# Altium footprint library CONNECTOR_JUMPER.PcbLib: 25 footprints (part 1 of 2)
Each footprint in its own frame and in the unit in brackets; x right, y up, seen from the top. Pads: shape width x height; smd on the part's side, far side on the other; paste and mask are expansions set on the pad; w line width, h text height; cw(c..) or ccw(c..) is an arc to the next point about the centre after c.
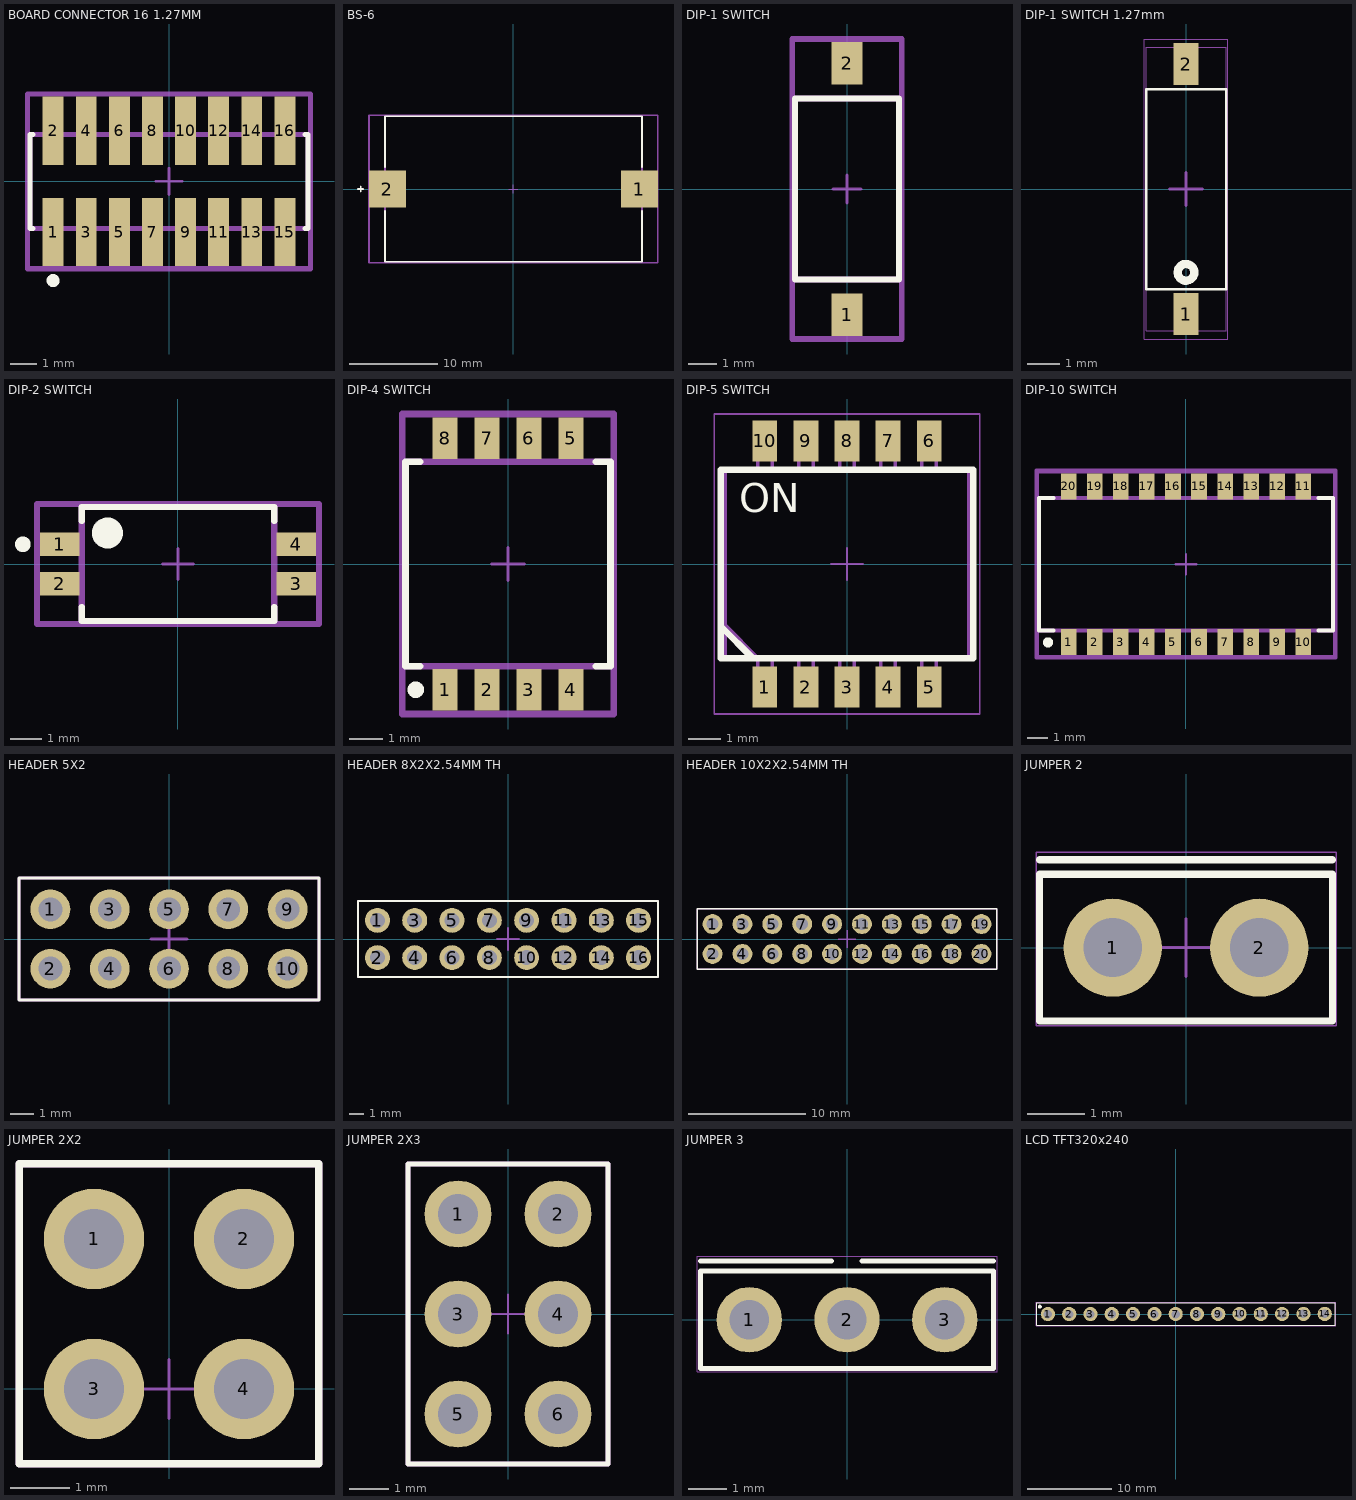
[diagram p0: the footprints below, top view; thin cyan lines are the x and y axes]

## BOARD CONNECTOR 16 1.27MM [mm]
pads (16):
  rect 0.8x2.62 smd paste+0 mask+0: 1(-4.445,-1.94) 2(-4.445,1.94) 3(-3.175,-1.94) 4(-3.175,1.94) 5(-1.905,-1.94) 6(-1.905,1.94) 7(-0.635,-1.94) 8(-0.635,1.94) 9(0.635,-1.94) 10(0.635,1.94) 11(1.905,-1.94) 12(1.905,1.94) 13(3.175,-1.94) 14(3.175,1.94) 15(4.445,-1.94) 16(4.445,1.94)
Top Overlay:
  circle w0.25: c-4.445,-3.805 r0.125
  lines w0.2: -5.22,-1.8 -5.33,-1.8 -5.33,1.8 -5.22,1.8 ; 5.22,-1.8 5.33,-1.8 5.33,1.8 5.22,1.8
Top Courtyard:
  lines w0.2: -5.43,-3.35 5.43,-3.35 5.43,3.35 -5.43,3.35 -5.43,-3.35
Top Assembly:
  lines w0.2: -5.43,-3.35 5.43,-3.35 5.43,3.35 -5.43,3.35 -5.43,-3.35
  text ".Designator" at 0,0.188 h1
Top 3D Body:
  lines w0.2: -5.33,-1.8 5.33,-1.8 5.33,1.8 -5.33,1.8 -5.33,-1.8
Top Component Center:
  lines w0.1: -0.5,0 0.5,0 ; 0,-0.5 0,0.5
3D body "Conn_Harwin_M50-3600842_eec.STEP": height 0.25, standoff 0, extent -5.43,-3.35 5.43,3.35

## BS-6 [mm]
pads (2):
  rect 4.2x4.2 smd paste+0: 1(14.275,0) 2(-14.275,0)
Top Overlay:
  lines w0.2: -17.6,0 -17,0 ; -17.3,-0.3 -17.3,0.3 ; -14.55,-2.475 -14.55,-8.25 14.55,-8.25 14.55,-2.475 ; -14.55,2.475 -14.55,8.25 14.55,8.25 14.55,2.475
Top Courtyard:
  lines w0.2: -16.35,-8.35 -16.35,8.35 16.35,8.35 16.35,-8.35 -16.35,-8.35
Top Assembly:
  lines w0.2: -16.35,-8.35 -16.35,8.35 16.35,8.35 16.35,-8.35 -16.35,-8.35
  text ".Designator" at 0,0 h1
Top 3D Body:
  lines w0.2: -14.55,-8.25 -14.55,8.25 14.55,8.25 14.55,-8.25 -14.55,-8.25
Top Component Center:
  lines w0.1: -0.5,0 0.5,0 ; 0,-0.5 0,0.5
3D body "Batt_Memory_Protection_Devices_BU2032SM-BT-GTR_eec.STEP": height 0.25, standoff 0, extent -16.35,-8.35 16.35,8.35

## DIP-1 SWITCH [mm]
pads (2):
  rect 1.1x1.5 smd paste+0 mask+0: 1(0,-4.45) 2(0,4.45)
Top Overlay:
  lines w0.2: -1.84,-3.2 -1.84,3.2 1.84,3.2 1.84,-3.2 -1.84,-3.2
Top Courtyard:
  lines w0.2: -1.94,-5.3 -1.94,5.3 1.94,5.3 1.94,-5.3 -1.94,-5.3
Top Assembly:
  lines w0.2: -1.94,-5.3 -1.94,5.3 1.94,5.3 1.94,-5.3 -1.94,-5.3
  text ".Designator" at 0,0 h1
Top 3D Body:
  lines w0.2: -1.84,-3.2 -1.84,3.2 1.84,3.2 1.84,-3.2 -1.84,-3.2
Top Component Center:
  lines w0.1: -0.5,0 0.5,0 ; 0,-0.5 0,0.5
3D body "Switch_Omron_Electronics_Inc-EMC_Div_A6S-1104-H_eec.STEP": height 0.25, standoff 0, extent -1.94,-5.3 1.94,5.3

## DIP-1 SWITCH 1.27mm [mm]
pads (2):
  rect 0.76x1.27 smd paste+0 mask+0.05: 1(0,-3.81) 2(0,3.81)
Top Overlay:
  circle w0.254: c0,-2.54 r0.254
  lines w0.076: -1.219,-3.048 1.219,-3.048 1.219,3.048 -1.219,3.048 -1.219,-3.048
Top Courtyard:
  lines w0.025: -1.27,-4.572 1.27,-4.572 1.27,4.572 -1.27,4.572 -1.27,-4.572
Top Assembly:
  lines w0.025: -1.27,-4.572 1.27,-4.572 1.27,4.572 -1.27,4.572 -1.27,-4.572
  text ".Designator" at 0,0 h1
Top 3D Body:
  lines w0.025: -1.219,-4.318 1.219,-4.318 1.219,4.318 -1.219,4.318 -1.219,-4.318
Mechanical 15:
  lines w0.025: -1.27,-4.572 1.27,-4.572 1.27,4.572 -1.27,4.572 -1.27,-4.572
Top Component Center:
  lines w0.1: -0.5,0 0.5,0 ; 0,-0.5 0,0.5
3D body "416131160801 (rev1).stp": height 2.65, standoff 0, extent -1.22,-4.32 1.22,4.32

## DIP-2 SWITCH [mm]
pads (4):
  rect 1.27x0.76 smd paste+0 mask+0: 1(-3.81,0.635) 2(-3.81,-0.635) 3(3.81,-0.635) 4(3.81,0.635)
Top Overlay:
  circle w0.5: c-2.275,1 r0.25
  circle w0.25: c-5,0.635 r0.125
  lines w0.2: -3.1,-1.39 -3.1,-1.835 3.1,-1.835 3.1,-1.39 ; -3.1,1.39 -3.1,1.835 3.1,1.835 3.1,1.39
Top Courtyard:
  lines w0.2: -4.545,-1.935 4.545,-1.935 4.545,1.935 -4.545,1.935 -4.545,-1.935
Top Assembly:
  lines w0.2: -4.545,-1.935 4.545,-1.935 4.545,1.935 -4.545,1.935 -4.545,-1.935
  text ".Designator" at 0,0 h1
Top 3D Body:
  lines w0.2: -3.1,-1.835 -3.1,1.835 3.1,1.835 3.1,-1.835 -3.1,-1.835
Top Component Center:
  lines w0.1: -0.5,0 0.5,0 ; 0,-0.5 0,0.5
3D body "Switch_C&K_Components_TDA02H0SB1_eec.STEP": height 0.25, standoff 0, extent -4.545,-1.935 4.545,1.935

## DIP-4 SWITCH [mm]
pads (8):
  rect 0.76x1.27 smd paste+0: 1(-1.905,-3.81) 2(-0.635,-3.81) 3(0.635,-3.81) 4(1.905,-3.81) 5(1.905,3.81) 6(0.635,3.81) 7(-0.635,3.81) 8(-1.905,3.81)
Top Overlay:
  circle w0.25: c-2.794,-3.81 r0.125
  lines w0.2: -2.66,-3.1 -3.105,-3.1 -3.105,3.1 -2.66,3.1 ; 2.66,-3.1 3.105,-3.1 3.105,3.1 2.66,3.1
Top Courtyard:
  lines w0.2: -3.205,-4.545 -3.205,4.545 3.205,4.545 3.205,-4.545 -3.205,-4.545
Top Assembly:
  lines w0.2: -3.205,-4.545 -3.205,4.545 3.205,4.545 3.205,-4.545 -3.205,-4.545
  text ".Designator" at 0,0.188 h1
Top 3D Body:
  lines w0.2: -3.105,-3.1 -3.105,3.1 3.105,3.1 3.105,-3.1 -3.105,-3.1
Top Component Center:
  lines w0.1: -0.5,0 0.5,0 ; 0,-0.5 0,0.5
3D body "Switch_C&K_Components_TDA04H0SB1_eec.STEP": height 0.25, standoff 0, extent -3.205,-4.545 3.205,4.545

## DIP-5 SWITCH [mm]
pads (10):
  rect 0.76x1.27 smd: 1(-2.54,-3.81) 2(-1.27,-3.81) 3(0,-3.81) 4(1.27,-3.81) 5(2.54,-3.81) 6(2.54,3.81) 7(1.27,3.81) 8(0,3.81) 9(-1.27,3.81) 10(-2.54,3.81)
Top Overlay:
  lines w0.2: -3.91,-1.925 -2.91,-2.925 ; -3.91,-2.925 3.91,-2.925 3.91,2.925 -3.91,2.925 -3.91,-2.925
  text "ON" at -3.34,1.6 h0.89
Top Courtyard:
  lines w0.05: -0.5,0 0.5,0 ; 0,-0.5 0,0.5 ; -4.11,-4.645 4.11,-4.645 4.11,4.645 -4.11,4.645 -4.11,-4.645
Top Designator:
  text ".Designator" at -7.498,-0.5 h1.5
Top Component Outline:
  lines w0.1: -3.76,-1.9 -2.76,-2.9 ; -2.765,-2.9 -2.765,-4.32 -2.315,-4.32 -2.315,-2.9 ; -2.765,2.9 -2.765,4.32 -2.315,4.32 -2.315,2.9 ; -1.495,-2.9 -1.495,-4.32 -1.045,-4.32 -1.045,-2.9 ; -1.495,2.9 -1.495,4.32 -1.045,4.32 -1.045,2.9 ; -0.225,-2.9 -0.225,-4.32 0.225,-4.32 0.225,-2.9 ; -0.225,2.9 -0.225,4.32 0.225,4.32 0.225,2.9 ; 1.045,-2.9 1.045,-4.32 1.495,-4.32 1.495,-2.9 ; 1.045,2.9 1.045,4.32 1.495,4.32 1.495,2.9 ; 2.315,-2.9 2.315,-4.32 2.765,-4.32 2.765,-2.9 ; 2.315,2.9 2.315,4.32 2.765,4.32 2.765,2.9 ; -3.76,-2.9 -3.76,2.9 3.76,2.9 3.76,-2.9 -3.76,-2.9
  text "ON" at -3.34,1.6 h0.89
3D body "416131160805.stp": height 2.65, standoff 0, extent -3.76,-4.22 3.76,4.22

## DIP-10 SWITCH [mm]
pads (20):
  rect 0.76x1.27 smd paste+0: 1(-5.715,-3.795) 2(-4.445,-3.795) 3(-3.175,-3.795) 4(-1.905,-3.795) 5(-0.635,-3.795) 6(0.635,-3.795) 7(1.905,-3.795) 8(3.175,-3.795) 9(4.445,-3.795) 10(5.715,-3.795) 11(5.715,3.795) 12(4.445,3.795) 13(3.175,3.795) 14(1.905,3.795) 15(0.635,3.795) 16(-0.635,3.795) 17(-1.905,3.795) 18(-3.175,3.795) 19(-4.445,3.795) 20(-5.715,3.795)
Top Overlay:
  circle w0.25: c-6.731,-3.81 r0.125
  lines w0.2: -6.47,-3.225 -7.165,-3.225 -7.165,3.225 -6.47,3.225 ; 6.47,-3.225 7.165,-3.225 7.165,3.225 6.47,3.225
Top Courtyard:
  lines w0.2: -7.265,-4.53 -7.265,4.53 7.265,4.53 7.265,-4.53 -7.265,-4.53
Top Assembly:
  lines w0.2: -7.265,-4.53 -7.265,4.53 7.265,4.53 7.265,-4.53 -7.265,-4.53
  text ".Designator" at 0,0.188 h1
Top 3D Body:
  lines w0.2: -7.165,-3.225 -7.165,3.225 7.165,3.225 7.165,-3.225 -7.165,-3.225
Mechanical 15:
  lines w0.127: -7.315,-4.572 -7.315,4.597 7.315,4.597 7.315,-4.572 -7.315,-4.572
Top Component Center:
  lines w0.1: -0.5,0 0.5,0 ; 0,-0.5 0,0.5
3D body "Switch_TE_Connectivity_1-1571983-3_eec.STEP": height 0.25, standoff 0, extent -7.265,-4.53 7.265,4.53

## HEADER 5X2 [mm]
pads (10):
  round 1.7 hole 1.02: 1(-5.08,1.27) 2(-5.08,-1.27) 3(-2.54,1.27) 4(-2.54,-1.27) 5(0,1.27) 6(0,-1.27) 7(2.54,1.27) 8(2.54,-1.27) 9(5.08,1.27) 10(5.08,-1.27)
Top Overlay:
  lines w0.127: -6.426,-2.616 6.426,-2.616 6.426,2.616 -6.426,2.616 -6.426,-2.616
Top Courtyard:
  lines w0.05: -3.04,1.27 -2.04,1.27 ; -2.54,0.77 -2.54,1.77
Top Assembly:
  text ".Designator" at 0,0.188 h1
Mechanical 15:
  lines w0.127: -6.426,-2.616 6.426,-2.616 6.426,2.616 -6.426,2.616 -6.426,-2.616
Top Component Center:
  lines w0.127: -0.762,0 0.762,0 ; 0,-0.762 0,0.762
3D body: height 7, standoff -1, extent -2.946,-1.676 -2.15,-0.878
3D body: height 7, standoff -1, extent -5.486,-1.676 -4.69,-0.878
3D body: height 1.5, standoff 0, extent -1.27,-2.54 1.27,0
3D body: height 1.5, standoff 0, extent -3.81,-2.54 -1.27,0
3D body: height 1.5, standoff 0, extent -6.35,-2.54 -3.81,0
3D body: height 7, standoff -1, extent 2.134,0.864 2.93,1.662
3D body: height 1.5, standoff 0, extent 1.27,0 3.81,2.54
3D body: height 7, standoff -1, extent -0.406,0.864 0.39,1.662
3D body: height 7, standoff -1, extent -2.946,0.864 -2.15,1.662
3D body: height 1.5, standoff 0, extent -1.27,0 1.27,2.54
3D body: height 1.5, standoff 0, extent -3.81,0 -1.27,2.54
3D body: height 1.5, standoff 0, extent -6.35,0 -3.81,2.54
3D body: height 7, standoff -1, extent -5.486,0.864 -4.69,1.662
3D body: height 7, standoff -1, extent 4.674,-1.676 5.47,-0.878
3D body: height 7, standoff -1, extent 2.134,-1.676 2.93,-0.878
3D body: height 1.5, standoff 0, extent 3.81,-2.54 6.35,0
3D body: height 1.5, standoff 0, extent 1.27,-2.54 3.81,0
3D body: height 7, standoff -1, extent -0.406,-1.676 0.39,-0.878
3D body: height 1.5, standoff 0, extent 3.81,0 6.35,2.54
3D body: height 7, standoff -1, extent 4.674,0.864 5.47,1.662

## HEADER 8X2X2.54MM TH [mm]
pads (16):
  round 1.7 hole 1.02: 1(-8.89,1.27) 2(-8.89,-1.27) 3(-6.35,1.27) 4(-6.35,-1.27) 5(-3.81,1.27) 6(-3.81,-1.27) 7(-1.27,1.27) 8(-1.27,-1.27) 9(1.27,1.27) 10(1.27,-1.27) 11(3.81,1.27) 12(3.81,-1.27) 13(6.35,1.27) 14(6.35,-1.27) 15(8.89,1.27) 16(8.89,-1.27)
Top Overlay:
  lines w0.127: -10.211,-2.591 -10.211,2.591 10.211,2.591 10.211,-2.591 -10.211,-2.591
Top Courtyard:
  lines w0.05: -6.85,1.27 -5.85,1.27 ; -6.35,0.77 -6.35,1.77 ; 3.31,1.27 4.31,1.27 ; 3.81,0.77 3.81,1.77
Top Assembly:
  text ".Designator" at 0,0.188 h1
Mechanical 15:
  lines w0.127: -10.211,-2.591 10.211,-2.591 10.211,2.591 -10.211,2.591 -10.211,-2.591
Top Component Center:
  lines w0.127: -0.762,0 0.762,0 ; 0,-0.762 0,0.762
3D body: height 7, standoff -1, extent 0.864,0.864 1.66,1.662
3D body: height 1.5, standoff 0, extent 0,0 2.54,2.54
3D body: height 7, standoff -1, extent -4.216,-1.676 -3.42,-0.878
3D body: height 1.5, standoff 0, extent -2.54,-2.54 0,0
3D body: height 1.5, standoff 0, extent 0,-2.54 2.54,0
3D body: height 7, standoff -1, extent -1.676,-1.676 -0.88,-0.878
3D body: height 7, standoff -1, extent 0.864,-1.676 1.66,-0.878
3D body: height 7, standoff -1, extent -9.296,0.864 -8.5,1.662
3D body: height 1.5, standoff 0, extent -10.16,0 -7.62,2.54
3D body: height 1.5, standoff 0, extent -7.62,0 -5.08,2.54
3D body: height 1.5, standoff 0, extent -5.08,0 -2.54,2.54
3D body: height 7, standoff -1, extent -6.756,0.864 -5.96,1.662
3D body: height 7, standoff -1, extent -4.216,0.864 -3.42,1.662
3D body: height 1.5, standoff 0, extent -2.54,0 0,2.54
3D body: height 7, standoff -1, extent -1.676,0.864 -0.88,1.662
3D body: height 1.5, standoff 0, extent -10.16,-2.54 -7.62,0
3D body: height 1.5, standoff 0, extent -7.62,-2.54 -5.08,0
3D body: height 1.5, standoff 0, extent -5.08,-2.54 -2.54,0
3D body: height 7, standoff -1, extent -9.296,-1.676 -8.5,-0.878
3D body: height 7, standoff -1, extent -6.756,-1.676 -5.96,-0.878
3D body: height 7, standoff -1, extent 5.944,-1.676 6.74,-0.878
3D body: height 1.5, standoff 0, extent 7.62,-2.54 10.16,0
3D body: height 7, standoff -1, extent 8.484,-1.676 9.28,-0.878
3D body: height 1.5, standoff 0, extent 2.54,0 5.08,2.54
3D body: height 1.5, standoff 0, extent 5.08,0 7.62,2.54
3D body: height 7, standoff -1, extent 3.404,0.864 4.2,1.662
3D body: height 7, standoff -1, extent 5.944,0.864 6.74,1.662
3D body: height 1.5, standoff 0, extent 7.62,0 10.16,2.54
3D body: height 7, standoff -1, extent 8.484,0.864 9.28,1.662
3D body: height 1.5, standoff 0, extent 2.54,-2.54 5.08,0
3D body: height 1.5, standoff 0, extent 5.08,-2.54 7.62,0
3D body: height 7, standoff -1, extent 3.404,-1.676 4.2,-0.878

## HEADER 10X2X2.54MM TH [mm]
pads (20):
  round 1.7 hole 1.02: 1(-11.43,1.27) 2(-11.43,-1.27) 3(-8.89,1.27) 4(-8.89,-1.27) 5(-6.35,1.27) 6(-6.35,-1.27) 7(-3.81,1.27) 8(-3.81,-1.27) 9(-1.27,1.27) 10(-1.27,-1.27) 11(1.27,1.27) 12(1.27,-1.27) 13(3.81,1.27) 14(3.81,-1.27) 15(6.35,1.27) 16(6.35,-1.27) 17(8.89,1.27) 18(8.89,-1.27) 19(11.43,1.27) 20(11.43,-1.27)
Top Overlay:
  lines w0.127: -12.751,-2.591 12.751,-2.591 12.751,2.591 -12.751,2.591 -12.751,-2.591
Top Courtyard:
  lines w0.05: -9.39,1.27 -8.39,1.27 ; -8.89,0.77 -8.89,1.77 ; 0.77,1.27 1.77,1.27 ; 1.27,0.77 1.27,1.77
Top Assembly:
  text ".Designator" at 0,0.188 h1
Mechanical 15:
  lines w0.127: -12.751,-2.591 12.751,-2.591 12.751,2.591 -12.751,2.591 -12.751,-2.591
Top Component Center:
  lines w0.127: -0.737,0 0.737,0 ; 0,-0.762 0,0.762
3D body: height 1.5, standoff 0, extent 10.16,-2.54 12.7,0
3D body: height 7, standoff -1, extent 11.024,-1.676 11.82,-0.878
3D body: height 1.5, standoff 0, extent 10.16,0 12.7,2.54
3D body: height 7, standoff -1, extent 11.024,0.864 11.82,1.662
3D body: height 1.5, standoff 0, extent 7.62,-2.54 10.16,0
3D body: height 7, standoff -1, extent 8.484,-1.676 9.28,-0.878
3D body: height 1.5, standoff 0, extent 7.62,0 10.16,2.54
3D body: height 7, standoff -1, extent 8.484,0.864 9.28,1.662
3D body: height 7, standoff -1, extent -1.676,0.864 -0.88,1.662
3D body: height 1.5, standoff 0, extent -2.54,0 0,2.54
3D body: height 7, standoff -1, extent -6.756,-1.676 -5.96,-0.878
3D body: height 1.5, standoff 0, extent -5.08,-2.54 -2.54,0
3D body: height 1.5, standoff 0, extent -2.54,-2.54 0,0
3D body: height 7, standoff -1, extent -4.216,-1.676 -3.42,-0.878
3D body: height 7, standoff -1, extent -1.676,-1.676 -0.88,-0.878
3D body: height 7, standoff -1, extent -11.836,0.864 -11.04,1.662
3D body: height 1.5, standoff 0, extent -12.7,0 -10.16,2.54
3D body: height 1.5, standoff 0, extent -10.16,0 -7.62,2.54
3D body: height 1.5, standoff 0, extent -7.62,0 -5.08,2.54
3D body: height 7, standoff -1, extent -9.296,0.864 -8.5,1.662
3D body: height 7, standoff -1, extent -6.756,0.864 -5.96,1.662
3D body: height 1.5, standoff 0, extent -5.08,0 -2.54,2.54
3D body: height 7, standoff -1, extent -4.216,0.864 -3.42,1.662
3D body: height 1.5, standoff 0, extent -12.7,-2.54 -10.16,0
3D body: height 1.5, standoff 0, extent -10.16,-2.54 -7.62,0
3D body: height 1.5, standoff 0, extent -7.62,-2.54 -5.08,0
3D body: height 7, standoff -1, extent -11.836,-1.676 -11.04,-0.878
3D body: height 7, standoff -1, extent -9.296,-1.676 -8.5,-0.878
3D body: height 7, standoff -1, extent 3.404,-1.676 4.2,-0.878
3D body: height 1.5, standoff 0, extent 5.08,-2.54 7.62,0
3D body: height 7, standoff -1, extent 5.944,-1.676 6.74,-0.878
3D body: height 1.5, standoff 0, extent 0,0 2.54,2.54
3D body: height 1.5, standoff 0, extent 2.54,0 5.08,2.54
3D body: height 7, standoff -1, extent 0.864,0.864 1.66,1.662
3D body: height 7, standoff -1, extent 3.404,0.864 4.2,1.662
3D body: height 1.5, standoff 0, extent 5.08,0 7.62,2.54
3D body: height 7, standoff -1, extent 5.944,0.864 6.74,1.662
3D body: height 1.5, standoff 0, extent 0,-2.54 2.54,0
3D body: height 1.5, standoff 0, extent 2.54,-2.54 5.08,0
3D body: height 7, standoff -1, extent 0.864,-1.676 1.66,-0.878

## JUMPER 2 [mm]
pads (2):
  round 1.7 hole 1.02: 1(-1.27,0) 2(1.27,0)
Top Overlay:
  lines w0.127: -2.54,1.524 2.54,1.524 ; -2.54,-1.27 2.54,-1.27 2.54,1.27 -2.54,1.27 -2.54,-1.27
Top Courtyard:
  lines w0.05: -0.5,0 0.5,0 ; 0,-0.5 0,0.5
Top Assembly:
  text ".Designator" at 0,0.188 h1
Mechanical 15:
  lines w0.025: -2.6,-1.35 2.6,-1.35 2.6,1.65 -2.6,1.65 -2.6,-1.35
3D body: height 1.5, standoff 0, extent -2.54,-1.27 0,1.27
3D body: height 1.5, standoff 0, extent 0,-1.27 2.54,1.27
3D body: height 7, standoff -1, extent -1.676,-0.406 -0.88,0.392
3D body: height 7, standoff -1, extent 0.864,-0.406 1.66,0.392
3D body "142270-3--3DModel-STEP-1.STEP": height 7.63, standoff 1.6, extent -2.49,-1.22 2.49,1.22

## JUMPER 2X2 [mm]
pads (4):
  round 1.7 hole 1.02: 1(-1.27,2.54) 2(1.27,2.54) 3(-1.27,0) 4(1.27,0)
Top Overlay:
  lines w0.127: -2.54,-1.27 2.54,-1.27 2.54,3.81 -2.54,3.81 -2.54,-1.27
Top Courtyard:
  lines w0.05: -0.5,0 0.5,0 ; 0,-0.5 0,0.5
Top Assembly:
  text ".Designator" at 0,0.188 h1
Mechanical 15:
  lines w0.127: -2.54,-1.27 2.54,-1.27 2.54,3.81 -2.54,3.81 -2.54,-1.27
3D body "142270-3--3DModel-STEP-1.STEP": height 7.63, standoff 1.6, extent -2.49,-1.22 2.49,1.22
3D body: height 1.5, standoff 0, extent -2.54,1.27 0,3.81
3D body: height 1.5, standoff 0, extent 0,1.27 2.54,3.81
3D body: height 7, standoff -1, extent -1.676,2.134 -0.88,2.932
3D body: height 7, standoff -1, extent 0.864,2.134 1.66,2.932
3D body: height 1.5, standoff 0, extent -2.54,-1.27 0,1.27
3D body: height 1.5, standoff 0, extent 0,-1.27 2.54,1.27
3D body: height 7, standoff -1, extent -1.676,-0.406 -0.88,0.392
3D body: height 7, standoff -1, extent 0.864,-0.406 1.66,0.392

## JUMPER 2X3 [mm]
pads (6):
  round 1.7 hole 1.02: 1(-1.27,2.54) 2(1.27,2.54) 3(-1.27,0) 4(1.27,0) 5(-1.27,-2.54) 6(1.27,-2.54)
Top Overlay:
  lines w0.127: -2.54,-3.81 2.54,-3.81 2.54,3.81 -2.54,3.81 -2.54,-3.81
Top Courtyard:
  lines w0.05: -0.5,0 0.5,0 ; 0,-0.5 0,0.5
Top Assembly:
  text ".Designator" at 0,0.188 h1
Mechanical 15:
  lines w0.127: -2.54,-3.81 2.54,-3.81 2.54,3.81 -2.54,3.81 -2.54,-3.81
3D body: height 7, standoff -1, extent 0.864,-2.946 1.66,-2.148
3D body: height 7, standoff -1, extent -1.676,-2.946 -0.88,-2.148
3D body: height 7, standoff -1, extent 0.864,-0.406 1.66,0.392
3D body: height 7, standoff -1, extent -1.676,-0.406 -0.88,0.392
3D body: height 1.5, standoff 0, extent 0,-3.81 2.54,-1.27
3D body: height 1.5, standoff 0, extent -2.54,-3.81 0,-1.27
3D body: height 1.5, standoff 0, extent 0,-1.27 2.54,1.27
3D body: height 1.5, standoff 0, extent -2.54,-1.27 0,1.27
3D body: height 7, standoff -1, extent 0.864,2.134 1.66,2.932
3D body: height 7, standoff -1, extent -1.676,2.134 -0.88,2.932
3D body: height 1.5, standoff 0, extent 0,1.27 2.54,3.81
3D body: height 1.5, standoff 0, extent -2.54,1.27 0,3.81
3D body "142270-3--3DModel-STEP-1.STEP": height 7.63, standoff 1.6, extent -2.49,-1.22 2.49,1.22

## JUMPER 3 [mm]
pads (3):
  round 1.7 hole 1.02: 1(-2.54,0) 2(0,0) 3(2.54,0)
Top Overlay:
  lines w0.127: -3.81,1.524 -0.406,1.524 ; 0.39,1.524 3.81,1.524 ; -3.81,-1.27 3.81,-1.27 3.81,1.27 -3.81,1.27 -3.81,-1.27
Top Courtyard:
  lines w0.05: -0.5,0 0.5,0 ; 0,-0.5 0,0.5
Top Assembly:
  text ".Designator" at 0,0.188 h1
Mechanical 15:
  lines w0.025: -3.9,-1.35 -3.9,1.65 3.9,1.65 3.9,-1.35 -3.9,-1.35
3D body "142270-3--3DModel-STEP-1.STEP": height 7.63, standoff 1.6, extent -1.22,-1.27 3.76,1.17
3D body: height 7, standoff -1, extent 2.134,-0.406 2.93,0.392
3D body: height 7, standoff -1, extent -0.406,-0.406 0.39,0.392
3D body: height 7, standoff -1, extent -2.946,-0.406 -2.15,0.392
3D body: height 1.5, standoff 0, extent 1.27,-1.27 3.81,1.27
3D body: height 1.5, standoff 0, extent -1.27,-1.27 1.27,1.27
3D body: height 1.5, standoff 0, extent -3.81,-1.27 -1.27,1.27

## LCD TFT320x240 [mm]
pads (14):
  round 1.7 hole 1.02: 1(-15.24,0) 2(-12.7,0) 3(-10.16,0) 4(-7.62,0) 5(-5.08,0) 6(-2.53,0.007) 7(0.01,0.007) 8(2.55,0.007) 9(5.09,0.007) 10(7.639,0.015) 11(10.179,0.015) 12(12.719,0.015) 13(15.269,0.022) 14(17.809,0.022)
Top Overlay:
  circle w0.254: c-16.205,0.889 r0.105
  lines w0.127: -16.586,-1.321 -16.586,1.346 19.079,1.346 19.079,-1.321 -16.586,-1.321
Top Assembly:
  text ".Designator" at 0.01,0.195 h1
Mechanical 15:
  lines w0.025: -16.662,-1.397 19.152,-1.397 19.152,1.422 -16.662,1.422 -16.662,-1.397
3D body: height 1.5, standoff 0, extent 13.999,-1.248 16.539,1.292
3D body: height 7, standoff -1, extent 14.863,-0.385 15.659,0.414
3D body: height 1.5, standoff 0, extent 16.539,-1.248 19.079,1.292
3D body: height 7, standoff -1, extent 17.412,-0.377 18.209,0.421
3D body: height 1.5, standoff 0, extent -16.51,-1.27 -13.97,1.27
3D body: height 1.5, standoff 0, extent -13.97,-1.27 -11.43,1.27
3D body: height 1.5, standoff 0, extent -11.43,-1.27 -8.89,1.27
3D body: height 7, standoff -1, extent -15.646,-0.406 -14.85,0.392
3D body: height 7, standoff -1, extent -13.106,-0.406 -12.31,0.392
3D body: height 7, standoff -1, extent -10.566,-0.406 -9.77,0.392
3D body: height 1.5, standoff 0, extent -8.89,-1.27 -6.35,1.27
3D body: height 1.5, standoff 0, extent -6.35,-1.27 -3.81,1.27
3D body: height 7, standoff -1, extent -8.017,-0.399 -7.22,0.399
3D body: height 7, standoff -1, extent -5.477,-0.399 -4.68,0.399
3D body: height 1.5, standoff 0, extent -3.8,-1.263 -1.26,1.277
3D body: height 1.5, standoff 0, extent -1.26,-1.263 1.28,1.277
3D body: height 7, standoff -1, extent -2.937,-0.399 -2.14,0.399
3D body: height 7, standoff -1, extent -0.397,-0.399 0.4,0.399
3D body: height 1.5, standoff 0, extent 1.28,-1.263 3.82,1.277
3D body: height 1.5, standoff 0, extent 3.82,-1.263 6.36,1.277
3D body: height 7, standoff -1, extent 2.153,-0.392 2.95,0.407
3D body: height 7, standoff -1, extent 4.693,-0.392 5.49,0.407
3D body: height 1.5, standoff 0, extent 6.369,-1.255 8.909,1.285
3D body: height 1.5, standoff 0, extent 8.909,-1.255 11.449,1.285
3D body: height 7, standoff -1, extent 7.233,-0.392 8.03,0.407
3D body: height 7, standoff -1, extent 9.773,-0.392 10.57,0.407
3D body: height 1.5, standoff 0, extent 11.449,-1.255 13.989,1.285
3D body: height 7, standoff -1, extent 12.323,-0.385 13.12,0.414